# Altium footprint library IDETEC.PcbLib: 275 footprints (part 16 of 18)
Each footprint in its own frame and in the unit in brackets; x right, y up, seen from the top. Pads: shape width x height; smd on the part's side, far side on the other; paste and mask are expansions set on the pad; w line width, h text height; cw(c..) or ccw(c..) is an arc to the next point about the centre after c.
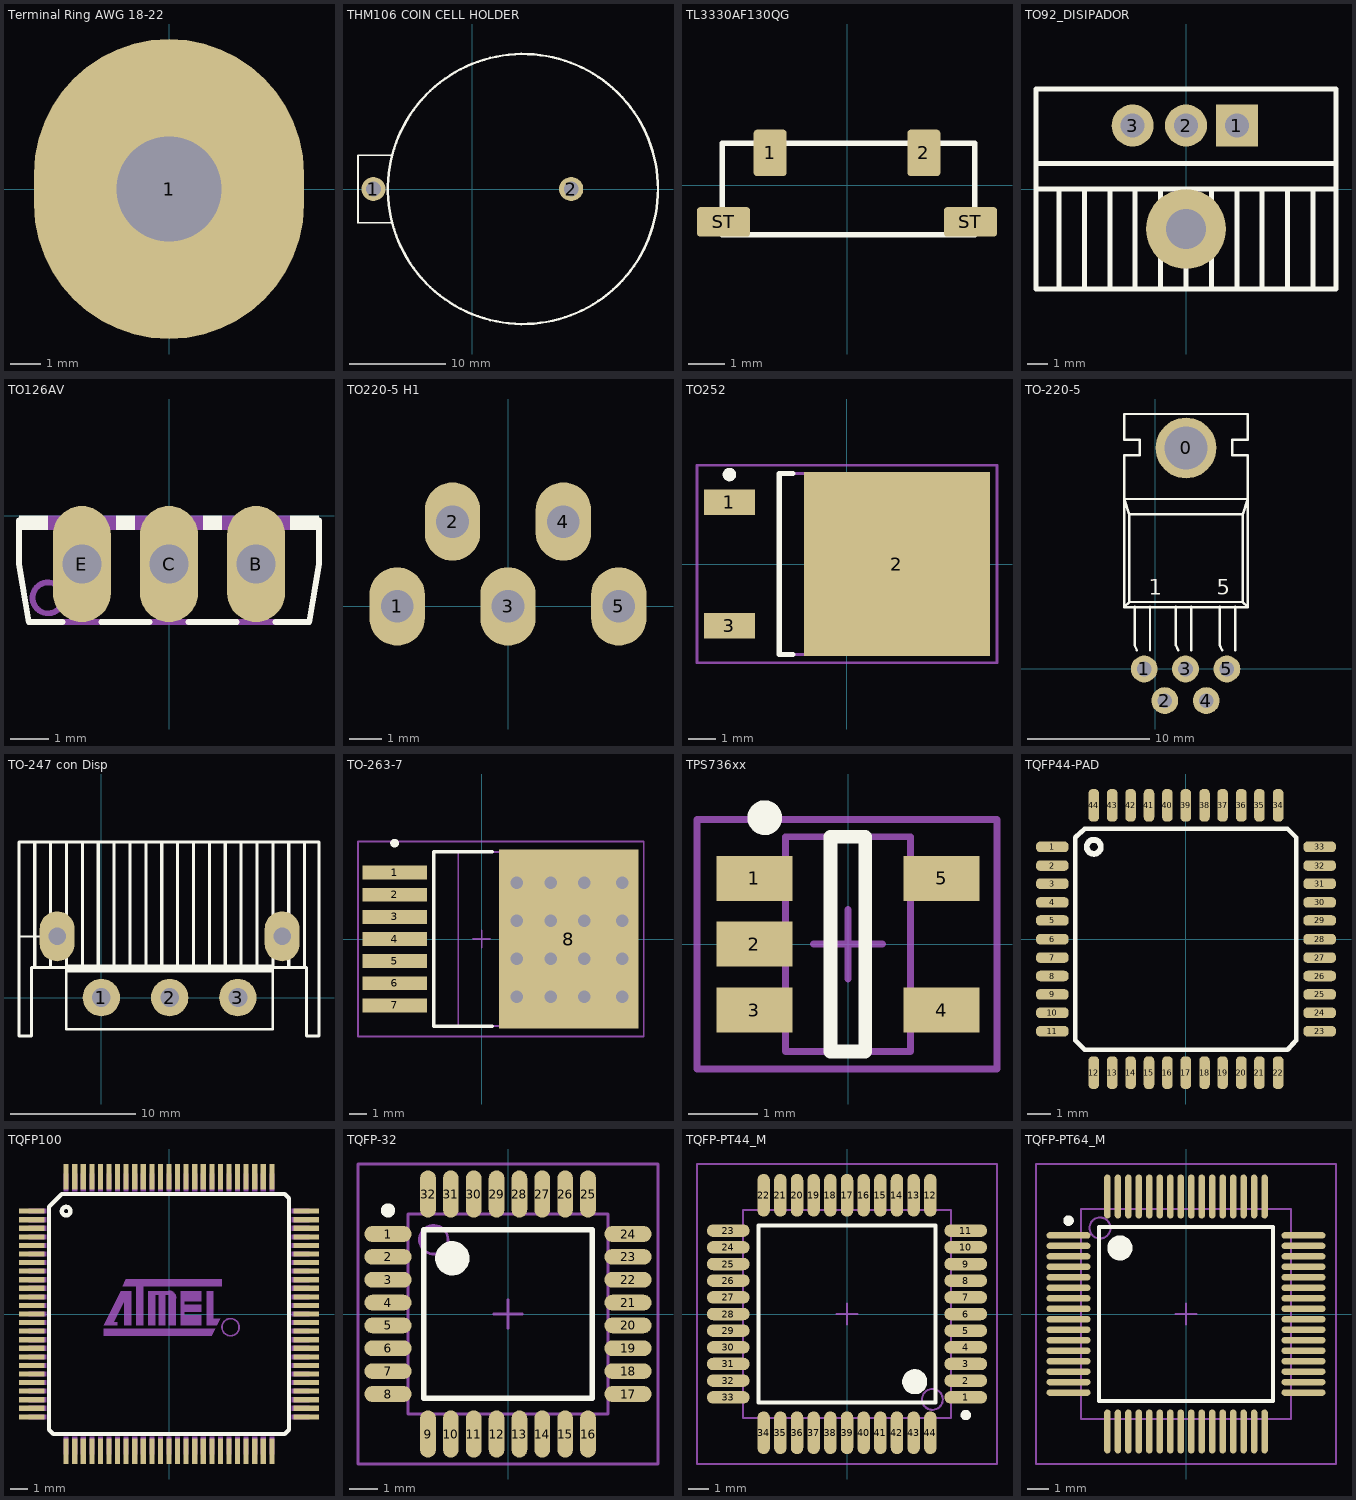
[diagram p15: the footprints below, top view; thin cyan lines are the x and y axes]

## Terminal Ring AWG 18-22 [mm]
height 5
pads (1):
  oval 9x10 hole 3.5 unplated: 1(0,0)
3D body "SW3dPS-tornillo pc l6.STEP": height 3.8, standoff -5, extent -4.196,-4.2 4.196,4.2
3D body "Terminal Ring AWG 14-16.STEP": height 5, standoff -1, extent -4.31,-4.33 4.3,16.625

## THM106 COIN CELL HOLDER [mm] "Keystone 20mm Lithium Coin Cell Battery Holders"
height 5.9
pads (2):
  round 2.5 hole 1.52: 1(-10.25,0) 2(10.25,0)
Top Overlay:
  circle w0.254: c5.25,0 r14
  lines w0.2: -8.375,3.5 -11.85,3.5 -11.85,-3.475 -11.825,-3.5 -8.3,-3.5
3D body "keyence_106 Coin Cell Holder.STEP": height 8.51, standoff -4.8, extent -11.85,-13.898 19.15,13.898

## TL3330AF130QG [mm] "Sw"
height 4
pads (4):
  rrect20% 0.9x1.27 smd: 1(-2.1,0.885) 2(2.1,0.885)
  rrect20% 1.45x0.8 smd: ST(-3.375,-1) ST(3.375,-1)
Top Overlay:
  lines w0.15: -3.412,-1.353 -3.412,1.147 3.488,1.147 3.488,-1.353 -3.412,-1.353
3D body "SW3dPS-E-Switch - TL3330AF130QG (Tact Switch, SMD).STEP": height 3.5, standoff 0, extent -3.905,-2.388 3.895,1.212

## TO92_DISIPADOR [mm] "DISIPADOR"
pads (4):
  rect 2.1x2.1 hole 1.2: 1(2.54,3.175)
  round 2.1 hole 1.2: 2(0,3.175) 3(-2.667,3.175)
  round 4 hole 2: ""(0,-2)
Top Overlay:
  lines w0.254: -7.5,0 7.5,0 ; -7.5,1.27 7.5,1.27 ; -6.35,-5 -6.35,0 ; -5.08,-5 -5.08,0 ; -3.81,-5 -3.81,0 ; -2.54,-5 -2.54,0 ; -1.27,-5 -1.27,0 ; 0,-5 0,0 ; 1.27,-5 1.27,0 ; 2.54,-5 2.54,0 ; 3.81,-5 3.81,0 ; 5.08,-5 5.08,0 ; 6.35,-5 6.35,0 ; -7.5,-5 -7.5,5 7.5,5 7.5,-5 -7.5,-5
3D body "SW3dPS-heatsink TO126.STEP": height 25, standoff -3.8, extent -7.391,-5.3 7.391,5.501
3D body "TO220AB.STEP": height 21.2, standoff -8.13, extent -5.782,0.25 5.432,4.94

## TO126AV [mil]
height 196.85
pads (3):
  oval 60x120 hole 40: B(90,-50) C(0,-50) E(-90,-50)
Top Overlay:
  rectangle: 125,-15 155,0
  rectangle: 35,-15 55,0
  rectangle: -55,-15 -35,0
  rectangle: -155,-15 -125,0
  lines w6: -155,-5 -155,-50 -145,-110 -110,-110 ; -70,-110 -20,-110 ; 20,-110 70,-110 ; 110,-110 145,-110 155,-50 155,-5
Mechanical 16:
  circle w6: c-125,-85 r16
  rectangle: 55,-15 125,0
  rectangle: -35,-15 35,0
  rectangle: -125,-15 -55,0
  lines w6: -110,-110 -70,-110 ; -20,-110 20,-110 ; 70,-110 110,-110
3D body "User Library-TO-126 (SOT32) Gold PCB.STEP": height 558.66, standoff -100, extent -149.61,-89.38 149.6,11.02

## TO220-5 H1 [mm] "Encapsulado TO-220(T) 5 Pines"
height 4.826
pads (5):
  oval 1.7x2.4 hole 1: 1(-3.4,0) 2(-1.702,2.6) 3(0,0) 4(1.7,2.6) 5(3.4,0)
3D body "TO220-5_Horizontal2.STEP": height 4.4, standoff -8.71, extent -5.1,-0.236 5.1,19.064

## TO252 [mm] "D-PAK, 3-Pads, Body 6.2x6.7mm (max), IPC Medium Density"
height 2.38
pads (3):
  rect 1.9x0.95 smd: 1(-4.35,2.285) 3(-4.35,-2.285)
  rect 6.9x6.8 smd: 2(1.85,0)
Top Overlay:
  circle w0.25: c-4.35,3.31 r0.125
  lines w0.2: -2,-3.35 -2.5,-3.35 -2.5,3.35 -2,3.35
Mechanical 13:
  lines w0.1: -2.5,-3.35 3.7,-3.35 3.7,3.35 -2.5,3.35 -2.5,-3.35
Mechanical 15:
  lines w0.1: -0.5,0 0.5,0 ; 0,-0.5 0,0.5 ; -5.55,-3.65 5.55,-3.65 5.55,3.65 -5.55,3.65 -5.55,-3.65
3D body "TO252.STEP": height 2.3, standoff -0.01, extent -4.826,-3.29 4.874,3.29

## TO-220-5 [mm]
pads (6):
  round 5 hole 3.5: 0(2.54,18.161)
  round 2.2 hole 1.2: 1(-0.9,0) 2(0.8,-2.6) 3(2.5,0) 4(4.2,-2.6) 5(5.9,0)
Top Overlay:
  lines w0.2: -1.687,5.119 -1.687,1.944 -1.495,1.539 ; -0.417,1.539 -0.417,5.119 ; 1.713,5.119 1.713,1.944 1.905,1.539 ; 2.983,1.539 2.983,5.119 ; 5.313,5.119 5.313,1.944 5.505,1.539 ; 6.583,1.539 6.583,5.119 ; -2.54,5.08 -2.117,5.503 ; -2.54,5.08 7.62,5.08 ; -2.54,5.08 -2.54,17.568 -1.27,17.568 -1.27,18.838 -2.54,18.838 -2.54,20.955 7.62,20.955 7.62,18.838 6.35,18.838 6.35,17.568 7.62,17.568 7.62,15.028 7.62,5.08 ; -2.117,5.503 7.197,5.503 ; -2.117,5.503 -2.117,12.7 ; -2.117,12.7 7.197,12.7 ; -2.117,12.7 -2.54,13.97 7.62,13.97 7.197,12.7 ; 7.197,5.503 7.197,12.7 ; 7.197,5.503 7.62,5.08
  text "1" at -0.508,6.096 h1.27
  text "5" at 5.08,6.096 h1.27
3D body "User Library-TO-220-5_bent_leads.STEP": height 5, standoff -5.9, extent -2.675,-1.2 7.725,21.025

## TO-247 con Disp [mm]
pads (5):
  round 3 hole 1.5: 1(0,0) 2(5.461,0) 3(10.922,0)
  rrect100% 2.8x4 hole 1.4: ""(-3.539,4.9) ""(14.461,4.9)
Top Overlay:
  lines w0.15: -6.59,-3.066 -6.59,4.9 -3.539,4.9
  lines w0.2: -2.794,2.117 13.716,2.117 ; -2.794,2.201 13.716,2.201 ; -2.794,2.328 13.716,2.328 ; -2.794,2.413 13.716,2.413 ; -2.794,-2.54 -2.794,2.54 13.716,2.54 13.716,-2.54 -2.794,-2.54
  lines w0.254: -5.59,2.398 -5.59,-3.066 -6.59,-3.066 -6.59,12.44 17.41,12.44 17.41,-3.066 16.41,-3.066 16.41,2.398 ; -5.59,2.4 16.41,2.4 ; -5.33,2.4 -5.33,12.44 ; -4.06,2.4 -4.06,12.44 ; -2.79,2.4 -2.79,12.44 ; -1.52,2.4 -1.52,12.44 ; -0.25,2.4 -0.25,12.44 ; 1.02,2.4 1.02,12.44 ; 2.29,2.4 2.29,12.44 ; 3.56,2.4 3.56,12.44 ; 4.83,2.4 4.83,12.44 ; 6.1,2.4 6.1,12.44 ; 7.37,2.4 7.37,12.44 ; 8.64,2.4 8.64,12.44 ; 9.91,2.4 9.91,12.44 ; 11.18,2.4 11.18,12.44 ; 12.45,2.4 12.45,12.44 ; 13.72,2.4 13.72,12.44 ; 14.99,2.4 14.99,12.44 ; 16.26,2.4 16.26,12.44
3D body "User Library-TO247.STEP": height 26.16, standoff -15.75, extent -2.63,-3.04 13.63,2.26
3D body "heatsink TO274.step": height 26, standoff -2, extent -6.177,-3.506 17.123,12.994

## TO-263-7 [mm] "Package     TO-263-7"
height 2
pads (8):
  rect 3.7x0.8 smd paste+0 mask+0: 1(-5,3.81) 2(-5,2.54) 3(-5,1.27) 4(-5,0) 5(-5,-1.27) 6(-5,-2.54) 7(-5,-3.81)
  rect 8x10.25 all layers, no hole paste+0 mask+0: 8(5,0)
via 2.007,-3.305 diameter 1.27 hole 0.711
via 3.96,-3.305 diameter 1.27 hole 0.711
via 5.891,-3.305 diameter 1.27 hole 0.711
via 8.07,-3.305 diameter 1.27 hole 0.711
via 2.007,-1.126 diameter 1.27 hole 0.711
via 3.96,-1.126 diameter 1.27 hole 0.711
via 5.891,-1.126 diameter 1.27 hole 0.711
via 8.07,-1.126 diameter 1.27 hole 0.711
via 2.007,1.053 diameter 1.27 hole 0.711
via 3.96,1.053 diameter 1.27 hole 0.711
via 5.891,1.053 diameter 1.27 hole 0.711
via 8.07,1.053 diameter 1.27 hole 0.711
via 8.07,3.232 diameter 1.27 hole 0.711
via 5.891,3.232 diameter 1.27 hole 0.711
via 3.96,3.232 diameter 1.27 hole 0.711
via 2.007,3.232 diameter 1.27 hole 0.711
Top Overlay:
  circle w0.25: c-5,5.5 r0.125
  lines w0.2: 0.6,-5 -2.75,-5 -2.75,5 0.6,5
Mechanical 13:
  lines w0.1: -1.35,-5 -1.35,5 7.9,5 7.9,-5 -1.35,-5
Mechanical 15:
  lines w0.1: -0.5,0 0.5,0 ; 0,-0.5 0,0.5 ; -7.1,-5.6 -7.1,5.6 9.3,5.6 9.3,-5.6 -7.1,-5.6
3D body "PG-TO263-7-1_C66065-A6551-C014-05-0004.stp": height 4.51, standoff 0, extent -6.4,-5 8.55,5

## TPS736xx [mm] "IC REG LDO 3.3V 0.4A SOT23-5"
height 5
pads (5):
  rect 1.1x0.65 smd: 1(-1.351,0.952) 2(-1.351,0.002) 3(-1.351,-0.948) 4(1.349,-0.948) 5(1.349,0.952)
Top Overlay:
  circle w0.25: c-1.201,1.827 r0.125
  lines w0.2: -0.251,-1.548 -0.251,1.552 0.249,1.552 0.249,-1.548 -0.251,-1.548
Mechanical 13:
  lines w0.1: -0.901,-1.548 0.899,-1.548 0.899,1.552 -0.901,1.552 -0.901,-1.548
Mechanical 15:
  lines w0.1: -0.501,0.002 0.499,0.002 ; -0.001,-0.498 -0.001,0.502 ; -2.179,-1.798 2.149,-1.798 2.149,1.802 -2.179,1.802 -2.179,-1.798
3D body "User Library-SOT-23-5-1.STEP": height 1.1, standoff 0, extent -1.251,-1.498 1.249,1.502

## TQFP44-PAD [mil] "TQFP44-PAD"
pads (44):
  rrect80% 56x18 smd: 1(-228.35,158) 2(-228.35,126) 3(-228.35,95) 4(-228.35,63) 5(-228.35,32) 6(-228.35,0) 7(-228.35,-31.5) 8(-228.35,-62.99) 9(-228.35,-94.49) 10(-228.35,-125.98) 11(-228.35,-157.48) 23(229,-157.48) 24(229,-125.98) 25(229,-94.49) 26(229,-62.99) 27(229,-31.5) 28(229,0) 29(229,32) 30(229,63) 31(229,95) 32(229,126) 33(229,158)
  rrect80% 18x56 smd: 12(-157.48,-228.35) 13(-125.98,-228.35) 14(-94.49,-228.35) 15(-62.99,-228.35) 16(-31.5,-228.35) 17(0,-228.35) 18(32,-228.35) 19(63,-228.35) 20(95,-228.35) 21(126,-228.35) 22(158,-228.35) 34(158,229) 35(126,229) 36(95,229) 37(63,229) 38(32,229) 39(0,229) 40(-31.5,229) 41(-62.99,229) 42(-94.49,229) 43(-125.98,229) 44(-157.48,229)
Top Overlay:
  circle w10: c-157.48,158 r12
  lines w8: -188.98,-173.23 -188.98,174 -173.23,189 174,189 189,174 189,-173.23 174,-188.98 -173.23,-188.98 -188.98,-173.23
3D body "User Library-TQFP-44-1.STEP": height 43.31, standoff 0, extent -236.22,-235.91 236.22,236.54

## TQFP100 [mm] "TQFP100"
pads (100):
  rect 1.5x0.3 smd: 1(-8,6) 2(-8,5.5) 3(-8,5) 4(-8,4.5) 5(-8,4) 6(-8,3.5) 7(-8,3) 8(-8,2.5) 9(-8,2) 10(-8,1.5) 11(-8,1) 12(-8,0.5) 13(-8,0) 14(-8,-0.5) 15(-8,-1) 16(-8,-1.5) 17(-8,-2) 18(-8,-2.5) 19(-8,-3) 20(-8,-3.5) 21(-8,-4) 22(-8,-4.5) 23(-8,-5) 24(-8,-5.5) 25(-8,-6) 51(8,-6) 52(8,-5.5) 53(8,-5) 54(8,-4.5) 55(8,-4) 56(8,-3.5) 57(8,-3) 58(8,-2.5) 59(8,-2) 60(8,-1.5) 61(8,-1) 62(8,-0.5) 63(8,0) 64(8,0.5) 65(8,1) 66(8,1.5) 67(8,2) 68(8,2.5) 69(8,3) 70(8,3.5) 71(8,4) 72(8,4.5) 73(8,5) 74(8,5.5) 75(8,6)
  rect 0.3x1.5 smd: 26(-6,-8) 27(-5.5,-8) 28(-5,-8) 29(-4.5,-8) 30(-4,-8) 31(-3.5,-8) 32(-3,-8) 33(-2.5,-8) 34(-2,-8) 35(-1.5,-8) 36(-1,-8) 37(-0.5,-8) 38(0,-8) 39(0.5,-8) 40(1,-8) 41(1.5,-8) 42(2,-8) 43(2.5,-8) 44(3,-8) 45(3.5,-8) 46(4,-8) 47(4.5,-8) 48(5,-8) 49(5.5,-8) 50(6,-8) 76(6,8) 77(5.5,8) 78(5,8) 79(4.5,8) 80(4,8) 81(3.5,8) 82(3,8) 83(2.5,8) 84(2,8) 85(1.5,8) 86(1,8) 87(0.5,8) 88(0,8) 89(-0.5,8) 90(-1,8) 91(-1.5,8) 92(-2,8) 93(-2.5,8) 94(-3,8) 95(-3.5,8) 96(-4,8) 97(-4.5,8) 98(-5,8) 99(-5.5,8) 100(-6,8)
Top Overlay:
  circle w0.254: c-6,6 r0.25
  lines w0.254: -7,-6.75 -6.75,-7 6.75,-7 7,-6.75 7,6.75 6.75,7 -6.25,7 -7,6.25 -7,-6.75
Mechanical 16:
  drawing of 108 lines, arcs and shapes, not listed
  text "TQFP 100" at -2.81,-2.48 h1.26
  text "R" at 3.39,-1.07 h0.94
3D body "User Library-100A-14x14.STEP": height 1, standoff -0.1, extent -8,-8 8,8

## TQFP-32 [mm] "32-Pin Thin Quad Flat Pack 0.8 mm Pitch, IPC Medium Density"
height 1.2
pads (32):
  oval 1.65x0.55 smd: 1(-4.2,2.8) 2(-4.2,2) 3(-4.2,1.2) 4(-4.2,0.4) 5(-4.2,-0.4) 6(-4.2,-1.2) 7(-4.2,-2) 8(-4.2,-2.8) 17(4.2,-2.8) 18(4.2,-2) 19(4.2,-1.2) 20(4.2,-0.4) 21(4.2,0.4) 22(4.2,1.2) 23(4.2,2) 24(4.2,2.8)
  oval 0.55x1.65 smd: 9(-2.8,-4.2) 10(-2,-4.2) 11(-1.2,-4.2) 12(-0.4,-4.2) 13(0.4,-4.2) 14(1.2,-4.2) 15(2,-4.2) 16(2.8,-4.2) 25(2.8,4.2) 26(2,4.2) 27(1.2,4.2) 28(0.4,4.2) 29(-0.4,4.2) 30(-1.2,4.2) 31(-2,4.2) 32(-2.8,4.2)
Top Overlay:
  circle w0.25: c-4.2,3.625 r0.125
  circle w0.6: c-1.95,1.95 r0.3
  lines w0.2: -2.95,-2.95 -2.95,2.95 2.95,2.95 2.95,-2.95 -2.95,-2.95
Mechanical 13:
  circle w0.1: c-2.6,2.6 r0.5
  lines w0.1: -3.5,-3.5 -3.5,3.5 3.5,3.5 3.5,-3.5 -3.5,-3.5
Mechanical 15:
  lines w0.1: -0.5,0 0.5,0 ; 0,-0.5 0,0.5 ; -5.25,-5.25 -5.25,5.25 5.25,5.25 5.25,-5.25 -5.25,-5.25
3D body "SW3dPS-tqfp32.STEP": height 1.2, standoff 0, extent -4.613,-4.605 4.586,4.594

## TQFP-PT44_M [mm] "Thin QFP, 44-Leads, Body 10x10mm, Pitch 0.8mm, IPC Low Density"
height 1.2
pads (44):
  oval 2.05x0.6 smd: 1(5.7,-4) 2(5.7,-3.2) 3(5.7,-2.4) 4(5.7,-1.6) 5(5.7,-0.8) 6(5.7,0) 7(5.7,0.8) 8(5.7,1.6) 9(5.7,2.4) 10(5.7,3.2) 11(5.7,4) 23(-5.7,4) 24(-5.7,3.2) 25(-5.7,2.4) 26(-5.7,1.6) 27(-5.7,0.8) 28(-5.7,0) 29(-5.7,-0.8) 30(-5.7,-1.6) 31(-5.7,-2.4) 32(-5.7,-3.2) 33(-5.7,-4)
  oval 0.6x2.05 smd: 12(4,5.7) 13(3.2,5.7) 14(2.4,5.7) 15(1.6,5.7) 16(0.8,5.7) 17(0,5.7) 18(-0.8,5.7) 19(-1.6,5.7) 20(-2.4,5.7) 21(-3.2,5.7) 22(-4,5.7) 34(-4,-5.7) 35(-3.2,-5.7) 36(-2.4,-5.7) 37(-1.6,-5.7) 38(-0.8,-5.7) 39(0,-5.7) 40(0.8,-5.7) 41(1.6,-5.7) 42(2.4,-5.7) 43(3.2,-5.7) 44(4,-5.7)
Top Overlay:
  circle w0.6: c3.25,-3.25 r0.3
  circle w0.25: c5.7,-4.85 r0.125
  lines w0.2: -4.25,-4.25 4.25,-4.25 4.25,4.25 -4.25,4.25 -4.25,-4.25
Mechanical 13:
  circle w0.1: c4.1,-4.1 r0.5
  lines w0.1: -5,-5 5,-5 5,5 -5,5 -5,-5
Mechanical 15:
  lines w0.1: -0.5,0 0.5,0 ; 0,-0.5 0,0.5 ; -7.2,-7.2 7.2,-7.2 7.2,7.2 -7.2,7.2 -7.2,-7.2
3D body "User Library-TQFP-44-1.STEP": height 1.1, standoff 0, extent -6,-6 6,6

## TQFP-PT64_M [mm] "Thin QFP, 64-Leads, Body 10x10mm, Pitch 0.5mm, IPC Low Density"
height 1.2
pads (64):
  oval 2.1x0.3 smd: 1(-5.6,3.75) 2(-5.6,3.25) 3(-5.6,2.75) 4(-5.6,2.25) 5(-5.6,1.75) 6(-5.6,1.25) 7(-5.6,0.75) 8(-5.6,0.25) 9(-5.6,-0.25) 10(-5.6,-0.75) 11(-5.6,-1.25) 12(-5.6,-1.75) 13(-5.6,-2.25) 14(-5.6,-2.75) 15(-5.6,-3.25) 16(-5.6,-3.75) 33(5.6,-3.75) 34(5.6,-3.25) 35(5.6,-2.75) 36(5.6,-2.25) 37(5.6,-1.75) 38(5.6,-1.25) 39(5.6,-0.75) 40(5.6,-0.25) 41(5.6,0.25) 42(5.6,0.75) 43(5.6,1.25) 44(5.6,1.75) 45(5.6,2.25) 46(5.6,2.75) 47(5.6,3.25) 48(5.6,3.75)
  oval 0.3x2.1 smd: 17(-3.75,-5.6) 18(-3.25,-5.6) 19(-2.75,-5.6) 20(-2.25,-5.6) 21(-1.75,-5.6) 22(-1.25,-5.6) 23(-0.75,-5.6) 24(-0.25,-5.6) 25(0.25,-5.6) 26(0.75,-5.6) 27(1.25,-5.6) 28(1.75,-5.6) 29(2.25,-5.6) 30(2.75,-5.6) 31(3.25,-5.6) 32(3.75,-5.6) 49(3.75,5.6) 50(3.25,5.6) 51(2.75,5.6) 52(2.25,5.6) 53(1.75,5.6) 54(1.25,5.6) 55(0.75,5.6) 56(0.25,5.6) 57(-0.25,5.6) 58(-0.75,5.6) 59(-1.25,5.6) 60(-1.75,5.6) 61(-2.25,5.6) 62(-2.75,5.6) 63(-3.25,5.6) 64(-3.75,5.6)
Top Overlay:
  circle w0.6: c-3.15,3.15 r0.3
  circle w0.25: c-5.6,4.45 r0.125
  lines w0.2: -4.15,-4.15 4.15,-4.15 4.15,4.15 -4.15,4.15 -4.15,-4.15
Mechanical 13:
  circle w0.1: c-4.1,4.1 r0.5
  lines w0.1: -5,-5 5,-5 5,5 -5,5 -5,-5
Mechanical 15:
  lines w0.1: -0.5,0 0.5,0 ; 0,-0.5 0,0.5 ; -7.15,-7.15 7.15,-7.15 7.15,7.15 -7.15,7.15 -7.15,-7.15
3D body "User Library-TQFP64_Grid_0_5.STEP": height 1.2, standoff 0, extent -6,-6 6,6